# Altium schematic symbol library jlcpcb_2025_04_resistors_extended_2512.schlib: 2667 symbols (part 11 of 14) (continued)
## RC-12L1R0JT
designator R?  Resistance: 1Ω  (hidden comment: *)
Resistor, 1Ω, ±5%, 1W, ±250ppm/℃, SMD 2512; Manufacturer: Uniroyal; Manufacturer Part Number: RC-12L1R0JT; Supplier 1: LCSC; Supplier Part Number 1: C310403; JLCPCB Part Number: C310403; Power Rating: 1W; Category: Resistors; Package Size: 2512; JLCPCB Basic Part: Yes; Tolerance: ±5%; Temperature Coefficient: ±250ppm/℃; ComponentLink1Description: Datasheet; ComponentLink1URL: https://wmsc.lcsc.com/wmsc/upload/file/pdf/v2/lcsc/2304140030_FH--Guangdong-Fenghua-Advanced-Tech-RC-12L1R0JT_C310403.pdf; ComponentLink2Description: JLCPCB Part URL; ComponentLink2URL: https://jlcpcb.com/partdetail/C310403
pins: 1, 2
1 alternate drawing of the same symbol

## RC-12L1R5JT
designator R?  Resistance: 1.5Ω  (hidden comment: *)
Resistor, 1.5Ω, ±5%, 1W, ±250ppm/℃, SMD 2512; Manufacturer: Uniroyal; Manufacturer Part Number: RC-12L1R5JT; Supplier 1: LCSC; Supplier Part Number 1: C327437; JLCPCB Part Number: C327437; Power Rating: 1W; Category: Resistors; Package Size: 2512; JLCPCB Basic Part: Yes; Tolerance: ±5%; Temperature Coefficient: ±250ppm/℃; ComponentLink1Description: Datasheet; ComponentLink1URL: https://wmsc.lcsc.com/wmsc/upload/file/pdf/v2/lcsc/2304140030_FH--Guangdong-Fenghua-Advanced-Tech-RC-12L1R5JT_C327437.pdf; ComponentLink2Description: JLCPCB Part URL; ComponentLink2URL: https://jlcpcb.com/partdetail/C327437
pins: 1, 2
1 alternate drawing of the same symbol

## RC-12L1R8JT
designator R?  Resistance: 1.8Ω  (hidden comment: *)
Resistor, 1.8Ω, ±5%, 1W, 200V, ±250ppm/℃, -55℃~+155℃, SMD 2512; Manufacturer: Uniroyal; Manufacturer Part Number: RC-12L1R8JT; Supplier 1: LCSC; Supplier Part Number 1: C327438; JLCPCB Part Number: C327438; Power Rating: 1W; Category: Resistors; Package Size: 2512; JLCPCB Basic Part: Yes; Tolerance: ±5%; Voltage Rating: 200V; Temperature Coefficient: ±250ppm/℃; Temperature Rating: -55℃~+155℃; ComponentLink1Description: Datasheet; ComponentLink1URL: https://wmsc.lcsc.com/wmsc/upload/file/pdf/v2/lcsc/2304140030_FH--Guangdong-Fenghua-Advanced-Tech-RC-12L1R8JT_C327438.pdf; ComponentLink2Description: JLCPCB Part URL; ComponentLink2URL: https://jlcpcb.com/partdetail/C327438
pins: 1, 2
1 alternate drawing of the same symbol

## RC-12L1R20FT
designator R?  Resistance: 1.2Ω  (hidden comment: *)
Resistor, 1.2Ω, ±1%, ±250ppm/℃, SMD 2512; Manufacturer: Uniroyal; Manufacturer Part Number: RC-12L1R20FT; Supplier 1: LCSC; Supplier Part Number 1: C4354878; JLCPCB Part Number: C4354878; Category: Resistors; Package Size: 2512; JLCPCB Basic Part: Yes; Tolerance: ±1%; Temperature Coefficient: ±250ppm/℃; ComponentLink1Description: Datasheet; ComponentLink1URL: https://wmsc.lcsc.com/wmsc/upload/file/pdf/v2/lcsc/2207121830_FH--Guangdong-Fenghua-Advanced-Tech-RC-12L1R20FT_C4354878.pdf; ComponentLink2Description: JLCPCB Part URL; ComponentLink2URL: https://jlcpcb.com/partdetail/C4354878
pins: 1, 2
1 alternate drawing of the same symbol

## RC-12L1R50FT
designator R?  Resistance: 1.5Ω  (hidden comment: *)
Resistor, 1.5Ω, ±1%, 1W, ±250ppm/℃, SMD 2512; Manufacturer: Uniroyal; Manufacturer Part Number: RC-12L1R50FT; Supplier 1: LCSC; Supplier Part Number 1: C327448; JLCPCB Part Number: C327448; Power Rating: 1W; Category: Resistors; Package Size: 2512; JLCPCB Basic Part: Yes; Tolerance: ±1%; Temperature Coefficient: ±250ppm/℃; ComponentLink1Description: Datasheet; ComponentLink1URL: https://wmsc.lcsc.com/wmsc/upload/file/pdf/v2/lcsc/2304140030_FH--Guangdong-Fenghua-Advanced-Tech-RC-12L1R50FT_C327448.pdf; ComponentLink2Description: JLCPCB Part URL; ComponentLink2URL: https://jlcpcb.com/partdetail/C327448
pins: 1, 2
1 alternate drawing of the same symbol

## RC-12L2R00FT
designator R?  Resistance: 2Ω  (hidden comment: *)
Resistor, 2Ω, ±1%, 1W, ±250ppm/℃, SMD 2512; Manufacturer: Uniroyal; Manufacturer Part Number: RC-12L2R00FT; Supplier 1: LCSC; Supplier Part Number 1: C880408; JLCPCB Part Number: C880408; Power Rating: 1W; Category: Resistors; Package Size: 2512; JLCPCB Basic Part: Yes; Tolerance: ±1%; Temperature Coefficient: ±250ppm/℃; ComponentLink1Description: Datasheet; ComponentLink1URL: https://wmsc.lcsc.com/wmsc/upload/file/pdf/v2/lcsc/2304140030_FH--Guangdong-Fenghua-Advanced-Tech-RC-12L2R00FT_C880408.pdf; ComponentLink2Description: JLCPCB Part URL; ComponentLink2URL: https://jlcpcb.com/partdetail/C880408
pins: 1, 2
1 alternate drawing of the same symbol

## RC-12L2R4JT
designator R?  Resistance: 2.4Ω  (hidden comment: *)
Resistor, 2.4Ω, ±5%, 1W, ±250ppm/℃, SMD 2512; Manufacturer: Uniroyal; Manufacturer Part Number: RC-12L2R4JT; Supplier 1: LCSC; Supplier Part Number 1: C327439; JLCPCB Part Number: C327439; Power Rating: 1W; Category: Resistors; Package Size: 2512; JLCPCB Basic Part: Yes; Tolerance: ±5%; Temperature Coefficient: ±250ppm/℃; ComponentLink1Description: Datasheet; ComponentLink1URL: https://wmsc.lcsc.com/wmsc/upload/file/pdf/v2/lcsc/2304140030_FH--Guangdong-Fenghua-Advanced-Tech-RC-12L2R4JT_C327439.pdf; ComponentLink2Description: JLCPCB Part URL; ComponentLink2URL: https://jlcpcb.com/partdetail/C327439
pins: 1, 2
1 alternate drawing of the same symbol

## RC-12L2R7JT
designator R?  Resistance: 2.7Ω  (hidden comment: *)
Resistor, 2.7Ω, ±5%, 1W, 200V, ±250ppm/℃, -55℃~+155℃, SMD 2512; Manufacturer: Uniroyal; Manufacturer Part Number: RC-12L2R7JT; Supplier 1: LCSC; Supplier Part Number 1: C327440; JLCPCB Part Number: C327440; Power Rating: 1W; Category: Resistors; Package Size: 2512; JLCPCB Basic Part: Yes; Tolerance: ±5%; Voltage Rating: 200V; Temperature Coefficient: ±250ppm/℃; Temperature Rating: -55℃~+155℃; ComponentLink1Description: Datasheet; ComponentLink1URL: https://wmsc.lcsc.com/wmsc/upload/file/pdf/v2/lcsc/2304140030_FH--Guangdong-Fenghua-Advanced-Tech-RC-12L2R7JT_C327440.pdf; ComponentLink2Description: JLCPCB Part URL; ComponentLink2URL: https://jlcpcb.com/partdetail/C327440
pins: 1, 2
1 alternate drawing of the same symbol

## RC-12L2R70FT
designator R?  Resistance: 2.7Ω  (hidden comment: *)
Resistor, 2.7Ω, ±1%, 1W, ±250ppm/℃, SMD 2512; Manufacturer: Uniroyal; Manufacturer Part Number: RC-12L2R70FT; Supplier 1: LCSC; Supplier Part Number 1: C327450; JLCPCB Part Number: C327450; Power Rating: 1W; Category: Resistors; Package Size: 2512; JLCPCB Basic Part: Yes; Tolerance: ±1%; Temperature Coefficient: ±250ppm/℃; ComponentLink1Description: Datasheet; ComponentLink1URL: https://wmsc.lcsc.com/wmsc/upload/file/pdf/v2/lcsc/2304140030_FH--Guangdong-Fenghua-Advanced-Tech-RC-12L2R70FT_C327450.pdf; ComponentLink2Description: JLCPCB Part URL; ComponentLink2URL: https://jlcpcb.com/partdetail/C327450
pins: 1, 2
1 alternate drawing of the same symbol

## RC-12L3R0JT
designator R?  Resistance: 3Ω  (hidden comment: *)
Resistor, 3Ω, ±5%, 1W, ±250ppm/℃, SMD 2512; Manufacturer: Uniroyal; Manufacturer Part Number: RC-12L3R0JT; Supplier 1: LCSC; Supplier Part Number 1: C327441; JLCPCB Part Number: C327441; Power Rating: 1W; Category: Resistors; Package Size: 2512; JLCPCB Basic Part: Yes; Tolerance: ±5%; Temperature Coefficient: ±250ppm/℃; ComponentLink1Description: Datasheet; ComponentLink1URL: https://wmsc.lcsc.com/wmsc/upload/file/pdf/v2/lcsc/2304140030_FH--Guangdong-Fenghua-Advanced-Tech-RC-12L3R0JT_C327441.pdf; ComponentLink2Description: JLCPCB Part URL; ComponentLink2URL: https://jlcpcb.com/partdetail/C327441
pins: 1, 2
1 alternate drawing of the same symbol

## RC-12L3R3JT
designator R?  Resistance: 3.3Ω  (hidden comment: *)
Resistor, 3.3Ω, ±5%, 1W, ±250ppm/℃, SMD 2512; Manufacturer: Uniroyal; Manufacturer Part Number: RC-12L3R3JT; Supplier 1: LCSC; Supplier Part Number 1: C341653; JLCPCB Part Number: C341653; Power Rating: 1W; Category: Resistors; Package Size: 2512; JLCPCB Basic Part: Yes; Tolerance: ±5%; Temperature Coefficient: ±250ppm/℃; ComponentLink1Description: Datasheet; ComponentLink1URL: https://wmsc.lcsc.com/wmsc/upload/file/pdf/v2/lcsc/2304140030_FH--Guangdong-Fenghua-Advanced-Tech-RC-12L3R3JT_C341653.pdf; ComponentLink2Description: JLCPCB Part URL; ComponentLink2URL: https://jlcpcb.com/partdetail/C341653
pins: 1, 2
1 alternate drawing of the same symbol

## RC-12L3R6JT
designator R?  Resistance: 3.6Ω  (hidden comment: *)
Resistor, 3.6Ω, ±5%, 1W, ±250ppm/℃, SMD 2512; Manufacturer: Uniroyal; Manufacturer Part Number: RC-12L3R6JT; Supplier 1: LCSC; Supplier Part Number 1: C327442; JLCPCB Part Number: C327442; Power Rating: 1W; Category: Resistors; Package Size: 2512; JLCPCB Basic Part: Yes; Tolerance: ±5%; Temperature Coefficient: ±250ppm/℃; ComponentLink1Description: Datasheet; ComponentLink1URL: https://wmsc.lcsc.com/wmsc/upload/file/pdf/v2/lcsc/2304140030_FH--Guangdong-Fenghua-Advanced-Tech-RC-12L3R6JT_C327442.pdf; ComponentLink2Description: JLCPCB Part URL; ComponentLink2URL: https://jlcpcb.com/partdetail/C327442
pins: 1, 2
1 alternate drawing of the same symbol

## RC-12L4R7JT
designator R?  Resistance: 4.7Ω  (hidden comment: *)
Resistor, 4.7Ω, ±5%, 1W, ±250ppm/℃, SMD 2512; Manufacturer: Uniroyal; Manufacturer Part Number: RC-12L4R7JT; Supplier 1: LCSC; Supplier Part Number 1: C341657; JLCPCB Part Number: C341657; Power Rating: 1W; Category: Resistors; Package Size: 2512; JLCPCB Basic Part: Yes; Tolerance: ±5%; Temperature Coefficient: ±250ppm/℃; ComponentLink1Description: Datasheet; ComponentLink1URL: https://wmsc.lcsc.com/wmsc/upload/file/pdf/v2/lcsc/2304140030_FH--Guangdong-Fenghua-Advanced-Tech-RC-12L4R7JT_C341657.pdf; ComponentLink2Description: JLCPCB Part URL; ComponentLink2URL: https://jlcpcb.com/partdetail/C341657
pins: 1, 2
1 alternate drawing of the same symbol

## RC-12L4R70FT
designator R?  Resistance: 4.7Ω  (hidden comment: *)
Resistor, 4.7Ω, ±1%, 1W, ±250ppm/℃, -55℃~+155℃, SMD 2512; Manufacturer: Uniroyal; Manufacturer Part Number: RC-12L4R70FT; Supplier 1: LCSC; Supplier Part Number 1: C2961512; JLCPCB Part Number: C2961512; Power Rating: 1W; Category: Resistors; Package Size: 2512; JLCPCB Basic Part: Yes; Tolerance: ±1%; Temperature Coefficient: ±250ppm/℃; Temperature Rating: -55℃~+155℃; ComponentLink1Description: Datasheet; ComponentLink1URL: https://wmsc.lcsc.com/wmsc/upload/file/pdf/v2/lcsc/2202211530_FH--Guangdong-Fenghua-Advanced-Tech-RC-12L4R70FT_C2961512.pdf; ComponentLink2Description: JLCPCB Part URL; ComponentLink2URL: https://jlcpcb.com/partdetail/C2961512
pins: 1, 2
1 alternate drawing of the same symbol

## RC-12L6R8JT
designator R?  Resistance: 6.8Ω  (hidden comment: *)
Resistor, 6.8Ω, ±5%, 1W, ±250ppm/℃, SMD 2512; Manufacturer: Uniroyal; Manufacturer Part Number: RC-12L6R8JT; Supplier 1: LCSC; Supplier Part Number 1: C341659; JLCPCB Part Number: C341659; Power Rating: 1W; Category: Resistors; Package Size: 2512; JLCPCB Basic Part: Yes; Tolerance: ±5%; Temperature Coefficient: ±250ppm/℃; ComponentLink1Description: Datasheet; ComponentLink1URL: https://wmsc.lcsc.com/wmsc/upload/file/pdf/v2/lcsc/2304140030_FH--Guangdong-Fenghua-Advanced-Tech-RC-12L6R8JT_C341659.pdf; ComponentLink2Description: JLCPCB Part URL; ComponentLink2URL: https://jlcpcb.com/partdetail/C341659
pins: 1, 2
1 alternate drawing of the same symbol

## RC-12000JT
designator R?  Resistance: 0Ω  (hidden comment: *)
Resistor, 0Ω, ±5%, 1W, 200V, -55℃~+155℃, SMD 2512; Manufacturer: Uniroyal; Manufacturer Part Number: RC-12000JT; Supplier 1: LCSC; Supplier Part Number 1: C304644; JLCPCB Part Number: C304644; Power Rating: 1W; Category: Resistors; Package Size: 2512; JLCPCB Basic Part: Yes; Tolerance: ±5%; Voltage Rating: 200V; Temperature Rating: -55℃~+155℃; ComponentLink1Description: Datasheet; ComponentLink2Description: JLCPCB Part URL; ComponentLink2URL: https://jlcpcb.com/partdetail/C304644
pins: 1, 2
1 alternate drawing of the same symbol

## RC-120000FT
designator R?  Resistance: 0Ω  (hidden comment: *)
Resistor, 0Ω, SMD 2512; Manufacturer: Uniroyal; Manufacturer Part Number: RC-120000FT; Supplier 1: LCSC; Supplier Part Number 1: C723334; JLCPCB Part Number: C723334; Category: Resistors; Package Size: 2512; JLCPCB Basic Part: Yes; ComponentLink1Description: Datasheet; ComponentLink1URL: https://wmsc.lcsc.com/wmsc/upload/file/pdf/v2/lcsc/2304140030_FH--Guangdong-Fenghua-Advanced-Tech-RC-120000FT_C723334.pdf; ComponentLink2Description: JLCPCB Part URL; ComponentLink2URL: https://jlcpcb.com/partdetail/C723334
pins: 1, 2
1 alternate drawing of the same symbol

## RCWE2512R100FKEA
designator R?  Resistance: 100mΩ  (hidden comment: *)
Resistor, 100mΩ, ±1%, 2W, 300V, ±100ppm/℃, -55℃~+155℃, SMD 2512; Manufacturer: Uniroyal; Manufacturer Part Number: RCWE2512R100FKEA; Supplier 1: LCSC; Supplier Part Number 1: C2093721; JLCPCB Part Number: C2093721; Power Rating: 2W; Category: Resistors; Package Size: 2512; JLCPCB Basic Part: Yes; Tolerance: ±1%; Voltage Rating: 300V; Temperature Coefficient: ±100ppm/℃; Temperature Rating: -55℃~+155℃; ComponentLink1Description: Datasheet; ComponentLink1URL: https://wmsc.lcsc.com/wmsc/upload/file/pdf/v2/lcsc/2304140030_Vishay-Intertech-RCWE2512R100FKEA_C2093721.pdf; ComponentLink2Description: JLCPCB Part URL; ComponentLink2URL: https://jlcpcb.com/partdetail/C2093721
pins: 1, 2
1 alternate drawing of the same symbol

## RCWE2512R250FKEA
designator R?  Resistance: 250mΩ  (hidden comment: *)
Resistor, 250mΩ, ±1%, 2W, 300V, ±100ppm/℃, -55℃~+155℃, SMD 2512; Manufacturer: Uniroyal; Manufacturer Part Number: RCWE2512R250FKEA; Supplier 1: LCSC; Supplier Part Number 1: C2091464; JLCPCB Part Number: C2091464; Power Rating: 2W; Category: Resistors; Package Size: 2512; JLCPCB Basic Part: Yes; Tolerance: ±1%; Voltage Rating: 300V; Temperature Coefficient: ±100ppm/℃; Temperature Rating: -55℃~+155℃; ComponentLink1Description: Datasheet; ComponentLink1URL: https://wmsc.lcsc.com/wmsc/upload/file/pdf/v2/lcsc/2304140030_Vishay-Intertech-RCWE2512R250FKEA_C2091464.pdf; ComponentLink2Description: JLCPCB Part URL; ComponentLink2URL: https://jlcpcb.com/partdetail/C2091464
pins: 1, 2
1 alternate drawing of the same symbol

## RCWE2512R500FKEA
designator R?  Resistance: 500mΩ  (hidden comment: *)
Resistor, 500mΩ, ±1%, 2W, 300V, ±100ppm/℃, -55℃~+155℃, SMD 2512; Manufacturer: Uniroyal; Manufacturer Part Number: RCWE2512R500FKEA; Supplier 1: LCSC; Supplier Part Number 1: C2075909; JLCPCB Part Number: C2075909; Power Rating: 2W; Category: Resistors; Package Size: 2512; JLCPCB Basic Part: Yes; Tolerance: ±1%; Voltage Rating: 300V; Temperature Coefficient: ±100ppm/℃; Temperature Rating: -55℃~+155℃; ComponentLink1Description: Datasheet; ComponentLink1URL: https://wmsc.lcsc.com/wmsc/upload/file/pdf/v2/lcsc/2304140030_Vishay-Intertech-RCWE2512R500FKEA_C2075909.pdf; ComponentLink2Description: JLCPCB Part URL; ComponentLink2URL: https://jlcpcb.com/partdetail/C2075909
pins: 1, 2
1 alternate drawing of the same symbol

## RCWE251250L0FNEA
designator R?  Resistance: 50mΩ  (hidden comment: *)
Resistor, 50mΩ, ±1%, 2W, 300V, ±200ppm/℃, -55℃~+155℃, SMD 2512; Manufacturer: Uniroyal; Manufacturer Part Number: RCWE251250L0FNEA; Supplier 1: LCSC; Supplier Part Number 1: C2084538; JLCPCB Part Number: C2084538; Power Rating: 2W; Category: Resistors; Package Size: 2512; JLCPCB Basic Part: Yes; Tolerance: ±1%; Voltage Rating: 300V; Temperature Coefficient: ±200ppm/℃; Temperature Rating: -55℃~+155℃; ComponentLink1Description: Datasheet; ComponentLink1URL: https://wmsc.lcsc.com/wmsc/upload/file/pdf/v2/lcsc/2304140030_Vishay-Intertech-RCWE251250L0FNEA_C2084538.pdf; ComponentLink2Description: JLCPCB Part URL; ComponentLink2URL: https://jlcpcb.com/partdetail/C2084538
pins: 1, 2
1 alternate drawing of the same symbol

## RK73B3ATTE3R0J
designator R?  Resistance: 3Ω  (hidden comment: *)
Resistor, 3Ω, ±5%, 1W, ±200ppm/℃, -55℃~+155℃, SMD 2512; Manufacturer: Uniroyal; Manufacturer Part Number: RK73B3ATTE3R0J; Supplier 1: LCSC; Supplier Part Number 1: C520385; JLCPCB Part Number: C520385; Power Rating: 1W; Category: Resistors; Package Size: 2512; JLCPCB Basic Part: Yes; Tolerance: ±5%; Temperature Coefficient: ±200ppm/℃; Temperature Rating: -55℃~+155℃; ComponentLink1Description: Datasheet; ComponentLink1URL: https://wmsc.lcsc.com/wmsc/upload/file/pdf/v2/lcsc/2403141434_KOA-Speer-Elec-RK73B3ATTE3R0J_C520385.pdf; ComponentLink2Description: JLCPCB Part URL; ComponentLink2URL: https://jlcpcb.com/partdetail/C520385
pins: 1, 2
1 alternate drawing of the same symbol

## RK73B3ATTE102J
designator R?  Resistance: 1kΩ  (hidden comment: *)
Resistor, 1kΩ, ±5%, 1W, ±200ppm/℃, -55℃~+155℃, SMD 2512; Manufacturer: Uniroyal; Manufacturer Part Number: RK73B3ATTE102J; Supplier 1: LCSC; Supplier Part Number 1: C830211; JLCPCB Part Number: C830211; Power Rating: 1W; Category: Resistors; Package Size: 2512; JLCPCB Basic Part: Yes; Tolerance: ±5%; Temperature Coefficient: ±200ppm/℃; Temperature Rating: -55℃~+155℃; ComponentLink1Description: Datasheet; ComponentLink1URL: https://wmsc.lcsc.com/wmsc/upload/file/pdf/v2/lcsc/2403141434_KOA-Speer-Elec-RK73B3ATTE102J_C830211.pdf; ComponentLink2Description: JLCPCB Part URL; ComponentLink2URL: https://jlcpcb.com/partdetail/C830211
pins: 1, 2
1 alternate drawing of the same symbol

## RK73B3ATTE105J
designator R?  Resistance: 1MΩ  (hidden comment: *)
Resistor, 1MΩ, ±5%, 1W, ±200ppm/℃, -55℃~+155℃, SMD 2512; Manufacturer: Uniroyal; Manufacturer Part Number: RK73B3ATTE105J; Supplier 1: LCSC; Supplier Part Number 1: C346106; JLCPCB Part Number: C346106; Power Rating: 1W; Category: Resistors; Package Size: 2512; JLCPCB Basic Part: Yes; Tolerance: ±5%; Temperature Coefficient: ±200ppm/℃; Temperature Rating: -55℃~+155℃; ComponentLink1Description: Datasheet; ComponentLink1URL: https://wmsc.lcsc.com/wmsc/upload/file/pdf/v2/lcsc/2403141434_KOA-Speer-Elec-RK73B3ATTE105J_C346106.pdf; ComponentLink2Description: JLCPCB Part URL; ComponentLink2URL: https://jlcpcb.com/partdetail/C346106
pins: 1, 2
1 alternate drawing of the same symbol

## RK73BW3ATTE5R1J
designator R?  Resistance: 5.1Ω  (hidden comment: *)
Resistor, 5.1Ω, ±5%, 1W, 200V, ±200ppm/℃, -55℃~+155℃, SMD 2512; Manufacturer: Uniroyal; Manufacturer Part Number: RK73BW3ATTE5R1J; Supplier 1: LCSC; Supplier Part Number 1: C514891; JLCPCB Part Number: C514891; Power Rating: 1W; Category: Resistors; Package Size: 2512; JLCPCB Basic Part: Yes; Tolerance: ±5%; Voltage Rating: 200V; Temperature Coefficient: ±200ppm/℃; Temperature Rating: -55℃~+155℃; ComponentLink1Description: Datasheet; ComponentLink1URL: https://wmsc.lcsc.com/wmsc/upload/file/pdf/v2/lcsc/2403141437_KOA-Speer-Elec-RK73BW3ATTE5R1J_C514891.pdf; ComponentLink2Description: JLCPCB Part URL; ComponentLink2URL: https://jlcpcb.com/partdetail/C514891
pins: 1, 2
1 alternate drawing of the same symbol

## RK73BW3ATTE154J
designator R?  Resistance: 150kΩ  (hidden comment: *)
Resistor, 150kΩ, ±5%, 1W, 200V, ±200ppm/℃, -55℃~+155℃, SMD 2512; Manufacturer: Uniroyal; Manufacturer Part Number: RK73BW3ATTE154J; Supplier 1: LCSC; Supplier Part Number 1: C276137; JLCPCB Part Number: C276137; Power Rating: 1W; Category: Resistors; Package Size: 2512; JLCPCB Basic Part: Yes; Tolerance: ±5%; Voltage Rating: 200V; Temperature Coefficient: ±200ppm/℃; Temperature Rating: -55℃~+155℃; ComponentLink1Description: Datasheet; ComponentLink1URL: https://wmsc.lcsc.com/wmsc/upload/file/pdf/v2/lcsc/2403141437_KOA-Speer-Elec-RK73BW3ATTE154J_C276137.pdf; ComponentLink2Description: JLCPCB Part URL; ComponentLink2URL: https://jlcpcb.com/partdetail/C276137
pins: 1, 2
1 alternate drawing of the same symbol

## RK73BW3ATTE303J
designator R?  Resistance: 30kΩ  (hidden comment: *)
Resistor, 30kΩ, ±5%, 1W, 200V, ±200ppm/℃, -55℃~+155℃, SMD 2512; Manufacturer: Uniroyal; Manufacturer Part Number: RK73BW3ATTE303J; Supplier 1: LCSC; Supplier Part Number 1: C514890; JLCPCB Part Number: C514890; Power Rating: 1W; Category: Resistors; Package Size: 2512; JLCPCB Basic Part: Yes; Tolerance: ±5%; Voltage Rating: 200V; Temperature Coefficient: ±200ppm/℃; Temperature Rating: -55℃~+155℃; ComponentLink1Description: Datasheet; ComponentLink1URL: https://wmsc.lcsc.com/wmsc/upload/file/pdf/v2/lcsc/2403141437_KOA-Speer-Elec-RK73BW3ATTE303J_C514890.pdf; ComponentLink2Description: JLCPCB Part URL; ComponentLink2URL: https://jlcpcb.com/partdetail/C514890
pins: 1, 2
1 alternate drawing of the same symbol

## RK73BW3ATTE470J
designator R?  Resistance: 47Ω  (hidden comment: *)
Resistor, 47Ω, ±5%, 1W, 200V, ±200ppm/℃, -55℃~+155℃, SMD 2512; Manufacturer: Uniroyal; Manufacturer Part Number: RK73BW3ATTE470J; Supplier 1: LCSC; Supplier Part Number 1: C159941; JLCPCB Part Number: C159941; Power Rating: 1W; Category: Resistors; Package Size: 2512; JLCPCB Basic Part: Yes; Tolerance: ±5%; Voltage Rating: 200V; Temperature Coefficient: ±200ppm/℃; Temperature Rating: -55℃~+155℃; ComponentLink1Description: Datasheet; ComponentLink1URL: https://wmsc.lcsc.com/wmsc/upload/file/pdf/v2/lcsc/2403141437_KOA-Speer-Elec-RK73BW3ATTE470J_C159941.pdf; ComponentLink2Description: JLCPCB Part URL; ComponentLink2URL: https://jlcpcb.com/partdetail/C159941
pins: 1, 2
1 alternate drawing of the same symbol

## RK73H3ATTE47R0F
designator R?  Resistance: 47Ω  (hidden comment: *)
Resistor, 47Ω, ±1%, 1W, ±100ppm/℃, -55℃~+155℃, SMD 2512; Manufacturer: Uniroyal; Manufacturer Part Number: RK73H3ATTE47R0F; Supplier 1: LCSC; Supplier Part Number 1: C516162; JLCPCB Part Number: C516162; Power Rating: 1W; Category: Resistors; Package Size: 2512; JLCPCB Basic Part: Yes; Tolerance: ±1%; Temperature Coefficient: ±100ppm/℃; Temperature Rating: -55℃~+155℃; ComponentLink1Description: Datasheet; ComponentLink1URL: https://wmsc.lcsc.com/wmsc/upload/file/pdf/v2/lcsc/2304140030_KOA-Speer-Elec-RK73H3ATTE47R0F_C516162.pdf; ComponentLink2Description: JLCPCB Part URL; ComponentLink2URL: https://jlcpcb.com/partdetail/C516162
pins: 1, 2
1 alternate drawing of the same symbol

## RK73H3ATTE1001F
designator R?  Resistance: 1kΩ  (hidden comment: *)
Resistor, 1kΩ, ±1%, 1W, ±100ppm/℃, -55℃~+155℃, SMD 2512; Manufacturer: Uniroyal; Manufacturer Part Number: RK73H3ATTE1001F; Supplier 1: LCSC; Supplier Part Number 1: C346145; JLCPCB Part Number: C346145; Power Rating: 1W; Category: Resistors; Package Size: 2512; JLCPCB Basic Part: Yes; Tolerance: ±1%; Temperature Coefficient: ±100ppm/℃; Temperature Rating: -55℃~+155℃; ComponentLink1Description: Datasheet; ComponentLink1URL: https://wmsc.lcsc.com/wmsc/upload/file/pdf/v2/lcsc/2304140030_KOA-Speer-Elec-RK73H3ATTE1001F_C346145.pdf; ComponentLink2Description: JLCPCB Part URL; ComponentLink2URL: https://jlcpcb.com/partdetail/C346145
pins: 1, 2
1 alternate drawing of the same symbol

## RK73HW3ATTE2R00F
designator R?  Resistance: 2Ω  (hidden comment: *)
Resistor, 2Ω, ±1%, 1W, ±200ppm/℃, SMD 2512; Manufacturer: Uniroyal; Manufacturer Part Number: RK73HW3ATTE2R00F; Supplier 1: LCSC; Supplier Part Number 1: C830427; JLCPCB Part Number: C830427; Power Rating: 1W; Category: Resistors; Package Size: 2512; JLCPCB Basic Part: Yes; Tolerance: ±1%; Temperature Coefficient: ±200ppm/℃; ComponentLink1Description: Datasheet; ComponentLink1URL: https://wmsc.lcsc.com/wmsc/upload/file/pdf/v2/lcsc/2009211610_KOA-Speer-Elec-RK73HW3ATTE2R00F_C830427.pdf; ComponentLink2Description: JLCPCB Part URL; ComponentLink2URL: https://jlcpcb.com/partdetail/C830427
pins: 1, 2
1 alternate drawing of the same symbol

## RK73HW3ATTE6R20F
designator R?  Resistance: 6.2Ω  (hidden comment: *)
Resistor, 6.2Ω, ±1%, 1W, 200V, ±100ppm/℃, -55℃~+155℃, SMD 2512; Manufacturer: Uniroyal; Manufacturer Part Number: RK73HW3ATTE6R20F; Supplier 1: LCSC; Supplier Part Number 1: C346153; JLCPCB Part Number: C346153; Power Rating: 1W; Category: Resistors; Package Size: 2512; JLCPCB Basic Part: Yes; Tolerance: ±1%; Voltage Rating: 200V; Temperature Coefficient: ±100ppm/℃; Temperature Rating: -55℃~+155℃; ComponentLink1Description: Datasheet; ComponentLink1URL: https://wmsc.lcsc.com/wmsc/upload/file/pdf/v2/lcsc/2304140030_KOA-Speer-Elec-RK73HW3ATTE6R20F_C346153.pdf; ComponentLink2Description: JLCPCB Part URL; ComponentLink2URL: https://jlcpcb.com/partdetail/C346153
pins: 1, 2
1 alternate drawing of the same symbol

## RK73HW3ATTE10R0F
designator R?  Resistance: 10Ω  (hidden comment: *)
Resistor, 10Ω, ±1%, 2W, 200V, -55℃~+155℃, SMD 2512; Manufacturer: Uniroyal; Manufacturer Part Number: RK73HW3ATTE10R0F; Supplier 1: LCSC; Supplier Part Number 1: C346150; JLCPCB Part Number: C346150; Power Rating: 2W; Category: Resistors; Package Size: 2512; JLCPCB Basic Part: Yes; Tolerance: ±1%; Voltage Rating: 200V; Temperature Rating: -55℃~+155℃; ComponentLink1Description: Datasheet; ComponentLink1URL: https://wmsc.lcsc.com/wmsc/upload/file/pdf/v2/lcsc/1912111437_KOA-Speer-Elec-RK73HW3ATTE10R0F_C346150.pdf; ComponentLink2Description: JLCPCB Part URL; ComponentLink2URL: https://jlcpcb.com/partdetail/C346150
pins: 1, 2
1 alternate drawing of the same symbol

## RK73HW3ATTE47R0F
designator R?  Resistance: 47Ω  (hidden comment: *)
Resistor, 47Ω, ±1%, 1W, 200V, -55℃~+155℃, SMD 2512; Manufacturer: Uniroyal; Manufacturer Part Number: RK73HW3ATTE47R0F; Supplier 1: LCSC; Supplier Part Number 1: C346152; JLCPCB Part Number: C346152; Power Rating: 1W; Category: Resistors; Package Size: 2512; JLCPCB Basic Part: Yes; Tolerance: ±1%; Voltage Rating: 200V; Temperature Rating: -55℃~+155℃; ComponentLink1Description: Datasheet; ComponentLink1URL: https://wmsc.lcsc.com/wmsc/upload/file/pdf/v2/lcsc/2304140030_KOA-Speer-Elec-RK73HW3ATTE47R0F_C346152.pdf; ComponentLink2Description: JLCPCB Part URL; ComponentLink2URL: https://jlcpcb.com/partdetail/C346152
pins: 1, 2
1 alternate drawing of the same symbol

## RK73HW3ATTE1001F
designator R?  Resistance: 1kΩ  (hidden comment: *)
Resistor, 1kΩ, ±1%, 1W, 200V, ±100ppm/℃, -55℃~+155℃, SMD 2512; Manufacturer: Uniroyal; Manufacturer Part Number: RK73HW3ATTE1001F; Supplier 1: LCSC; Supplier Part Number 1: C346149; JLCPCB Part Number: C346149; Power Rating: 1W; Category: Resistors; Package Size: 2512; JLCPCB Basic Part: Yes; Tolerance: ±1%; Voltage Rating: 200V; Temperature Coefficient: ±100ppm/℃; Temperature Rating: -55℃~+155℃; ComponentLink1Description: Datasheet; ComponentLink1URL: https://wmsc.lcsc.com/wmsc/upload/file/pdf/v2/lcsc/1912111437_KOA-Speer-Elec-RK73HW3ATTE1001F_C346149.pdf; ComponentLink2Description: JLCPCB Part URL; ComponentLink2URL: https://jlcpcb.com/partdetail/C346149
pins: 1, 2
1 alternate drawing of the same symbol

## RK73HW3ATTE2400F
designator R?  Resistance: 240Ω  (hidden comment: *)
Resistor, 240Ω, ±1%, 1W, 200V, -55℃~+155℃, SMD 2512; Manufacturer: Uniroyal; Manufacturer Part Number: RK73HW3ATTE2400F; Supplier 1: LCSC; Supplier Part Number 1: C346151; JLCPCB Part Number: C346151; Power Rating: 1W; Category: Resistors; Package Size: 2512; JLCPCB Basic Part: Yes; Tolerance: ±1%; Voltage Rating: 200V; Temperature Rating: -55℃~+155℃; ComponentLink1Description: Datasheet; ComponentLink1URL: https://wmsc.lcsc.com/wmsc/upload/file/pdf/v2/lcsc/2304140030_KOA-Speer-Elec-RK73HW3ATTE2400F_C346151.pdf; ComponentLink2Description: JLCPCB Part URL; ComponentLink2URL: https://jlcpcb.com/partdetail/C346151
pins: 1, 2
1 alternate drawing of the same symbol

## RK73HW3ATTE2700F
designator R?  Resistance: 270Ω  (hidden comment: *)
Resistor, 270Ω, ±1%, 1W, 200V, ±100ppm/℃, -55℃~+155℃, SMD 2512; Manufacturer: Uniroyal; Manufacturer Part Number: RK73HW3ATTE2700F; Supplier 1: LCSC; Supplier Part Number 1: C525557; JLCPCB Part Number: C525557; Power Rating: 1W; Category: Resistors; Package Size: 2512; JLCPCB Basic Part: Yes; Tolerance: ±1%; Voltage Rating: 200V; Temperature Coefficient: ±100ppm/℃; Temperature Rating: -55℃~+155℃; ComponentLink1Description: Datasheet; ComponentLink1URL: https://wmsc.lcsc.com/wmsc/upload/file/pdf/v2/lcsc/2304140030_KOA-Speer-Elec-RK73HW3ATTE2700F_C525557.pdf; ComponentLink2Description: JLCPCB Part URL; ComponentLink2URL: https://jlcpcb.com/partdetail/C525557
pins: 1, 2
1 alternate drawing of the same symbol

## RK73Z3ATTE
designator R?  Resistance: 0Ω  (hidden comment: *)
Resistor, 0Ω, -55℃~+155℃, SMD 2512; Manufacturer: Uniroyal; Manufacturer Part Number: RK73Z3ATTE; Supplier 1: LCSC; Supplier Part Number 1: C160101; JLCPCB Part Number: C160101; Category: Resistors; Package Size: 2512; JLCPCB Basic Part: Yes; Temperature Rating: -55℃~+155℃; ComponentLink1Description: Datasheet; ComponentLink1URL: https://wmsc.lcsc.com/wmsc/upload/file/pdf/v2/lcsc/1810170026_KOA-Speer-Elec-RK73Z3ATTE_C160101.pdf; ComponentLink2Description: JLCPCB Part URL; ComponentLink2URL: https://jlcpcb.com/partdetail/C160101
pins: 1, 2
1 alternate drawing of the same symbol

## RK73ZW3ATTE
designator R?  Resistance: 0Ω  (hidden comment: *)
Resistor, 0Ω, SMD 2512; Manufacturer: Uniroyal; Manufacturer Part Number: RK73ZW3ATTE; Supplier 1: LCSC; Supplier Part Number 1: C830428; JLCPCB Part Number: C830428; Category: Resistors; Package Size: 2512; JLCPCB Basic Part: Yes; ComponentLink1Description: Datasheet; ComponentLink1URL: https://wmsc.lcsc.com/wmsc/upload/file/pdf/v2/lcsc/2009211610_KOA-Speer-Elec-RK73ZW3ATTE_C830428.pdf; ComponentLink2Description: JLCPCB Part URL; ComponentLink2URL: https://jlcpcb.com/partdetail/C830428
pins: 1, 2
1 alternate drawing of the same symbol

## RL25FENR750
designator R?  Resistance: 750mΩ  (hidden comment: *)
Resistor, 750mΩ, ±1%, 1W, ±200ppm/℃, -55℃~+155℃, SMD 2512; Manufacturer: Uniroyal; Manufacturer Part Number: RL25FENR750; Supplier 1: LCSC; Supplier Part Number 1: C2941600; JLCPCB Part Number: C2941600; Power Rating: 1W; Category: Resistors; Package Size: 2512; JLCPCB Basic Part: Yes; Tolerance: ±1%; Temperature Coefficient: ±200ppm/℃; Temperature Rating: -55℃~+155℃; ComponentLink1Description: Datasheet; ComponentLink1URL: https://wmsc.lcsc.com/wmsc/upload/file/pdf/v2/lcsc/2201121900_TA-I-Tech-RL25FENR750_C2941600.pdf; ComponentLink2Description: JLCPCB Part URL; ComponentLink2URL: https://jlcpcb.com/partdetail/C2941600
pins: 1, 2
1 alternate drawing of the same symbol

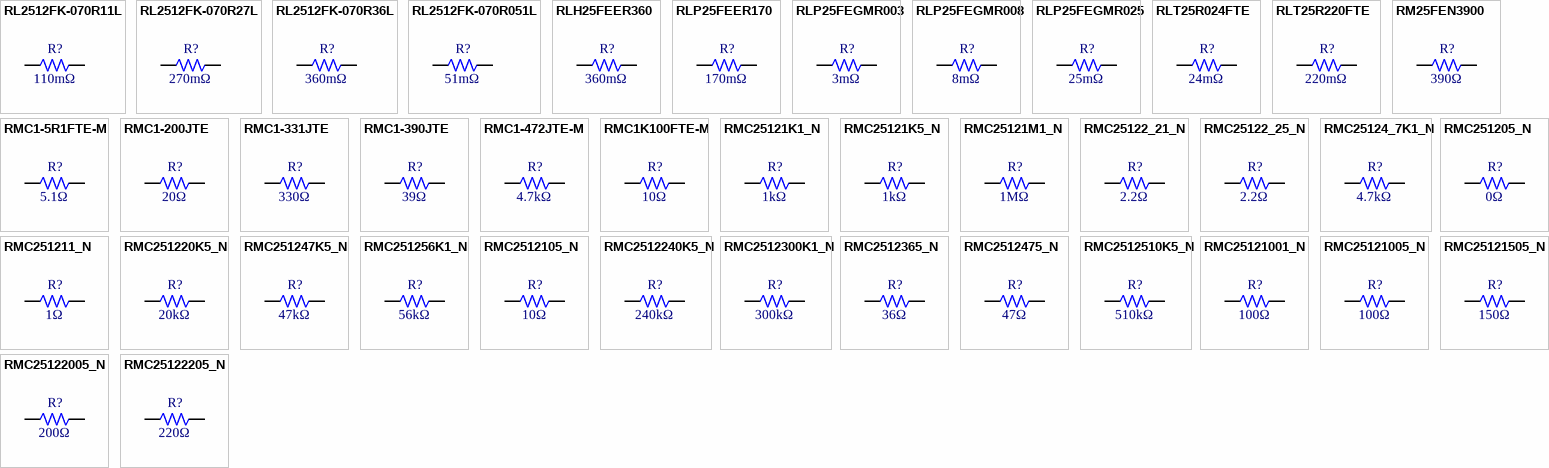
[diagram p52: symbols RL2512FK-070R11L to RMC25122205_N]

## RL2512FK-070R11L
designator R?  Resistance: 110mΩ  (hidden comment: *)
Resistor, 110mΩ, ±1%, 1W, ±600ppm/℃, -55℃~+155℃, SMD 2512; Manufacturer: Uniroyal; Manufacturer Part Number: RL2512FK-070R11L; Supplier 1: LCSC; Supplier Part Number 1: C876467; JLCPCB Part Number: C876467; Power Rating: 1W; Category: Resistors; Package Size: 2512; JLCPCB Basic Part: Yes; Tolerance: ±1%; Temperature Coefficient: ±600ppm/℃; Temperature Rating: -55℃~+155℃; ComponentLink1Description: Datasheet; ComponentLink1URL: https://wmsc.lcsc.com/wmsc/upload/file/pdf/v2/lcsc/2112231430_YAGEO-RL2512FK-070R11L_C876467.pdf; ComponentLink2Description: JLCPCB Part URL; ComponentLink2URL: https://jlcpcb.com/partdetail/C876467
pins: 1, 2
1 alternate drawing of the same symbol

## RL2512FK-070R27L
designator R?  Resistance: 270mΩ  (hidden comment: *)
Resistor, 270mΩ, ±1%, 1W, ±600ppm/℃, -55℃~+155℃, SMD 2512; Manufacturer: Uniroyal; Manufacturer Part Number: RL2512FK-070R27L; Supplier 1: LCSC; Supplier Part Number 1: C876476; JLCPCB Part Number: C876476; Power Rating: 1W; Category: Resistors; Package Size: 2512; JLCPCB Basic Part: Yes; Tolerance: ±1%; Temperature Coefficient: ±600ppm/℃; Temperature Rating: -55℃~+155℃; ComponentLink1Description: Datasheet; ComponentLink1URL: https://wmsc.lcsc.com/wmsc/upload/file/pdf/v2/lcsc/2112141030_YAGEO-RL2512FK-070R27L_C876476.pdf; ComponentLink2Description: JLCPCB Part URL; ComponentLink2URL: https://jlcpcb.com/partdetail/C876476
pins: 1, 2
1 alternate drawing of the same symbol

## RL2512FK-070R36L
designator R?  Resistance: 360mΩ  (hidden comment: *)
Resistor, 360mΩ, ±1%, 1W, ±600ppm/℃, -55℃~+155℃, SMD 2512; Manufacturer: Uniroyal; Manufacturer Part Number: RL2512FK-070R36L; Supplier 1: LCSC; Supplier Part Number 1: C876478; JLCPCB Part Number: C876478; Power Rating: 1W; Category: Resistors; Package Size: 2512; JLCPCB Basic Part: Yes; Tolerance: ±1%; Temperature Coefficient: ±600ppm/℃; Temperature Rating: -55℃~+155℃; ComponentLink1Description: Datasheet; ComponentLink1URL: https://wmsc.lcsc.com/wmsc/upload/file/pdf/v2/lcsc/2210202330_YAGEO-RL2512FK-070R36L_C876478.pdf; ComponentLink2Description: JLCPCB Part URL; ComponentLink2URL: https://jlcpcb.com/partdetail/C876478
pins: 1, 2
1 alternate drawing of the same symbol

## RL2512FK-070R051L
designator R?  Resistance: 51mΩ  (hidden comment: *)
Resistor, 51mΩ, ±1%, 1W, ±800ppm/℃, -55℃~+155℃, SMD 2512; Manufacturer: Uniroyal; Manufacturer Part Number: RL2512FK-070R051L; Supplier 1: LCSC; Supplier Part Number 1: C876459; JLCPCB Part Number: C876459; Power Rating: 1W; Category: Resistors; Package Size: 2512; JLCPCB Basic Part: Yes; Tolerance: ±1%; Temperature Coefficient: ±800ppm/℃; Temperature Rating: -55℃~+155℃; ComponentLink1Description: Datasheet; ComponentLink1URL: https://wmsc.lcsc.com/wmsc/upload/file/pdf/v2/lcsc/2112231430_YAGEO-RL2512FK-070R051L_C876459.pdf; ComponentLink2Description: JLCPCB Part URL; ComponentLink2URL: https://jlcpcb.com/partdetail/C876459
pins: 1, 2
1 alternate drawing of the same symbol

## RLH25FEER360
designator R?  Resistance: 360mΩ  (hidden comment: *)
Resistor, 360mΩ, ±1%, SMD 2512; Manufacturer: Uniroyal; Manufacturer Part Number: RLH25FEER360; Supplier 1: LCSC; Supplier Part Number 1: C912991; JLCPCB Part Number: C912991; Category: Resistors; Package Size: 2512; JLCPCB Basic Part: Yes; Tolerance: ±1%; ComponentLink1Description: Datasheet; ComponentLink1URL: https://wmsc.lcsc.com/wmsc/upload/file/pdf/v2/lcsc/2201101700_TA-I-Tech-RLH25FEER360_C912991.pdf; ComponentLink2Description: JLCPCB Part URL; ComponentLink2URL: https://jlcpcb.com/partdetail/C912991
pins: 1, 2
1 alternate drawing of the same symbol

## RLP25FEER170
designator R?  Resistance: 170mΩ  (hidden comment: *)
Resistor, 170mΩ, ±1%, SMD 2512; Manufacturer: Uniroyal; Manufacturer Part Number: RLP25FEER170; Supplier 1: LCSC; Supplier Part Number 1: C912985; JLCPCB Part Number: C912985; Category: Resistors; Package Size: 2512; JLCPCB Basic Part: Yes; Tolerance: ±1%; ComponentLink1Description: Datasheet; ComponentLink1URL: https://wmsc.lcsc.com/wmsc/upload/file/pdf/v2/lcsc/2201101700_TA-I-Tech-RLP25FEER170_C912985.pdf; ComponentLink2Description: JLCPCB Part URL; ComponentLink2URL: https://jlcpcb.com/partdetail/C912985
pins: 1, 2
1 alternate drawing of the same symbol

## RLP25FEGMR003
designator R?  Resistance: 3mΩ  (hidden comment: *)
Resistor, 3mΩ, ±1%, SMD 2512; Manufacturer: Uniroyal; Manufacturer Part Number: RLP25FEGMR003; Supplier 1: LCSC; Supplier Part Number 1: C912997; JLCPCB Part Number: C912997; Category: Resistors; Package Size: 2512; JLCPCB Basic Part: Yes; Tolerance: ±1%; ComponentLink1Description: Datasheet; ComponentLink1URL: https://wmsc.lcsc.com/wmsc/upload/file/pdf/v2/lcsc/2304140030_TA-I-Tech-RLP25FEGMR003_C912997.pdf; ComponentLink2Description: JLCPCB Part URL; ComponentLink2URL: https://jlcpcb.com/partdetail/C912997
pins: 1, 2
1 alternate drawing of the same symbol

## RLP25FEGMR008
designator R?  Resistance: 8mΩ  (hidden comment: *)
Resistor, 8mΩ, ±1%, SMD 2512; Manufacturer: Uniroyal; Manufacturer Part Number: RLP25FEGMR008; Supplier 1: LCSC; Supplier Part Number 1: C913000; JLCPCB Part Number: C913000; Category: Resistors; Package Size: 2512; JLCPCB Basic Part: Yes; Tolerance: ±1%; ComponentLink1Description: Datasheet; ComponentLink1URL: https://wmsc.lcsc.com/wmsc/upload/file/pdf/v2/lcsc/2304140030_TA-I-Tech-RLP25FEGMR008_C913000.pdf; ComponentLink2Description: JLCPCB Part URL; ComponentLink2URL: https://jlcpcb.com/partdetail/C913000
pins: 1, 2
1 alternate drawing of the same symbol

## RLP25FEGMR025
designator R?  Resistance: 25mΩ  (hidden comment: *)
Resistor, 25mΩ, ±1%, SMD 2512; Manufacturer: Uniroyal; Manufacturer Part Number: RLP25FEGMR025; Supplier 1: LCSC; Supplier Part Number 1: C913005; JLCPCB Part Number: C913005; Category: Resistors; Package Size: 2512; JLCPCB Basic Part: Yes; Tolerance: ±1%; ComponentLink1Description: Datasheet; ComponentLink1URL: https://wmsc.lcsc.com/wmsc/upload/file/pdf/v2/lcsc/2304140030_TA-I-Tech-RLP25FEGMR025_C913005.pdf; ComponentLink2Description: JLCPCB Part URL; ComponentLink2URL: https://jlcpcb.com/partdetail/C913005
pins: 1, 2
1 alternate drawing of the same symbol

## RLT25R024FTE
designator R?  Resistance: 24mΩ  (hidden comment: *)
Resistor, 24mΩ, ±1%, 1W, ±1200ppm/℃, -55℃~+155℃, SMD 2512; Manufacturer: Uniroyal; Manufacturer Part Number: RLT25R024FTE; Supplier 1: LCSC; Supplier Part Number 1: C2991341; JLCPCB Part Number: C2991341; Power Rating: 1W; Category: Resistors; Package Size: 2512; JLCPCB Basic Part: Yes; Tolerance: ±1%; Temperature Coefficient: ±1200ppm/℃; Temperature Rating: -55℃~+155℃; ComponentLink1Description: Datasheet; ComponentLink1URL: https://wmsc.lcsc.com/wmsc/upload/file/pdf/v2/lcsc/2204081930_RALEC-RLT25R024FTE_C2991341.pdf; ComponentLink2Description: JLCPCB Part URL; ComponentLink2URL: https://jlcpcb.com/partdetail/C2991341
pins: 1, 2
1 alternate drawing of the same symbol

## RLT25R220FTE
designator R?  Resistance: 220mΩ  (hidden comment: *)
Resistor, 220mΩ, ±1%, 1W, ±900ppm/℃, -55℃~+155℃, SMD 2512; Manufacturer: Uniroyal; Manufacturer Part Number: RLT25R220FTE; Supplier 1: LCSC; Supplier Part Number 1: C2937078; JLCPCB Part Number: C2937078; Power Rating: 1W; Category: Resistors; Package Size: 2512; JLCPCB Basic Part: Yes; Tolerance: ±1%; Temperature Coefficient: ±900ppm/℃; Temperature Rating: -55℃~+155℃; ComponentLink1Description: Datasheet; ComponentLink1URL: https://wmsc.lcsc.com/wmsc/upload/file/pdf/v2/lcsc/2201121800_RALEC-RLT25R220FTE_C2937078.pdf; ComponentLink2Description: JLCPCB Part URL; ComponentLink2URL: https://jlcpcb.com/partdetail/C2937078
pins: 1, 2
1 alternate drawing of the same symbol

## RM25FEN3900
designator R?  Resistance: 390Ω  (hidden comment: *)
Resistor, 390Ω, ±1%, 1W, 200V, ±100ppm/℃, -55℃~+155℃, SMD 2512; Manufacturer: Uniroyal; Manufacturer Part Number: RM25FEN3900; Supplier 1: LCSC; Supplier Part Number 1: C2941598; JLCPCB Part Number: C2941598; Power Rating: 1W; Category: Resistors; Package Size: 2512; JLCPCB Basic Part: Yes; Tolerance: ±1%; Voltage Rating: 200V; Temperature Coefficient: ±100ppm/℃; Temperature Rating: -55℃~+155℃; ComponentLink1Description: Datasheet; ComponentLink1URL: https://wmsc.lcsc.com/wmsc/upload/file/pdf/v2/lcsc/2201121900_TA-I-Tech-RM25FEN3900_C2941598.pdf; ComponentLink2Description: JLCPCB Part URL; ComponentLink2URL: https://jlcpcb.com/partdetail/C2941598
pins: 1, 2
1 alternate drawing of the same symbol

## RMC1-5R1FTE-M
designator R?  Resistance: 5.1Ω  (hidden comment: *)
Resistor, 5.1Ω, ±1%, 1W, -200ppm/℃~+500ppm/℃, SMD 2512; Manufacturer: Uniroyal; Manufacturer Part Number: RMC1-5R1FTE-M; Supplier 1: LCSC; Supplier Part Number 1: C340488; JLCPCB Part Number: C340488; Power Rating: 1W; Category: Resistors; Package Size: 2512; JLCPCB Basic Part: Yes; Tolerance: ±1%; Temperature Coefficient: -200ppm/℃~+500ppm/℃; ComponentLink1Description: Datasheet; ComponentLink1URL: https://wmsc.lcsc.com/wmsc/upload/file/pdf/v2/lcsc/2304140030_KAMAYA-RMC1-5R1FTE-M_C340488.pdf; ComponentLink2Description: JLCPCB Part URL; ComponentLink2URL: https://jlcpcb.com/partdetail/C340488
pins: 1, 2
1 alternate drawing of the same symbol
